# Altium footprint library 7SEG.PCBLIB: 21 footprints (part 2 of 2)
Each footprint in its own frame and in the unit in brackets; x right, y up, seen from the top. Pads: shape width x height; smd on the part's side, far side on the other; paste and mask are expansions set on the pad; w line width, h text height; cw(c..) or ccw(c..) is an arc to the next point about the centre after c.
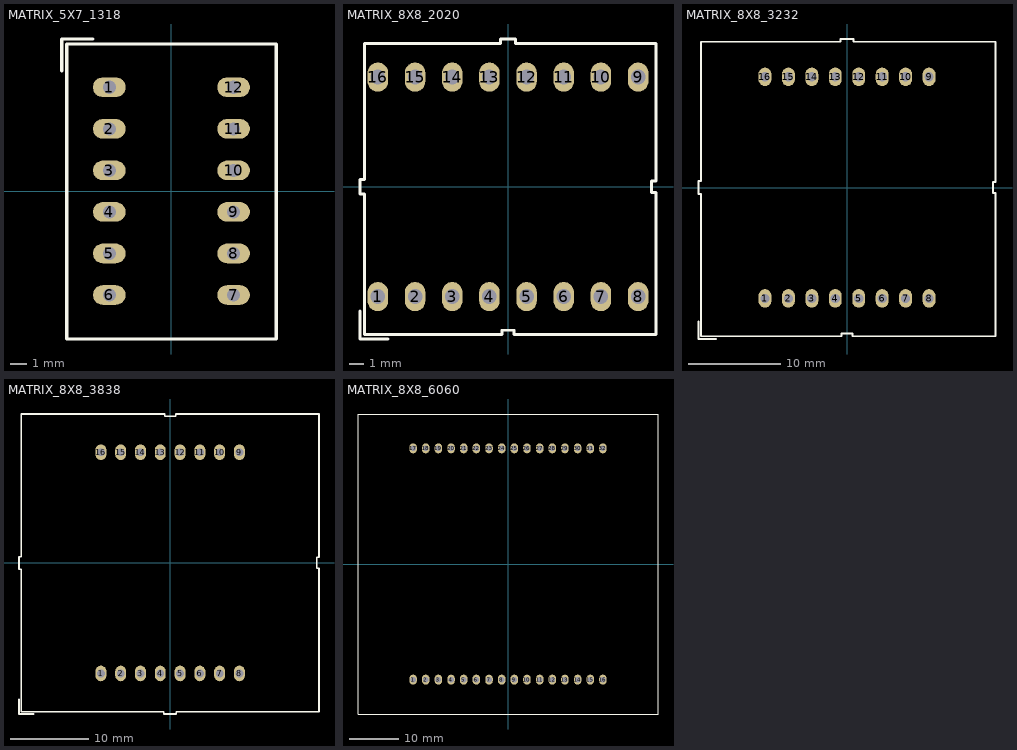
[diagram p1: the footprints below, top view; thin cyan lines are the x and y axes]

## MATRIX_5X7_1318 [mm] "LED Dot Matrix 5x7 12.7mmx17.8mm"
height 15.7
pads (12):
  oval 2x1.2 hole 0.8: 1(-3.8,6.35) 2(-3.8,3.81) 3(-3.8,1.27) 4(-3.8,-1.27) 5(-3.8,-3.81) 6(-3.8,-6.35) 7(3.8,-6.35) 8(3.8,-3.81) 9(3.8,-1.27) 10(3.8,1.27) 11(3.8,3.81) 12(3.8,6.35)
TopOverlay:
  lines w0.2: -6.7,7.36 -6.7,9.3 -4.8,9.3 ; -6.4,-9.04 -6.4,9 6.4,9 6.4,-9.04 -6.4,-9.04
3D body "User Library-18mm DOTMATRIX DISPLAY.step": height 6.4, standoff -5.5, extent -6.35,-8.89 6.35,8.89

## MATRIX_8X8_2020 [mm] "LED Dot Matrix 8x8 20mmx20mm"
height 15.7
pads (16):
  oval 1.4x2 hole 1: 1(-8.89,-7.5) 2(-6.35,-7.5) 3(-3.81,-7.5) 4(-1.27,-7.5) 5(1.27,-7.5) 6(3.81,-7.5) 7(6.35,-7.5) 8(8.89,-7.5) 9(8.89,7.5) 10(6.35,7.5) 11(3.81,7.5) 12(1.27,7.5) 13(-1.27,7.5) 14(-3.81,7.5) 15(-6.35,7.5) 16(-8.89,7.5)
TopOverlay:
  lines w0.2: -10.1,-8.5 -10.1,-10.4 -8.2,-10.4 ; -10.1,-0.5 -10.1,0.5 -9.8,0.5 -9.8,9.8 -0.5,9.8 -0.5,10.1 0.5,10.1 0.5,9.8 10.1,9.8 10.1,0.4 9.8,0.4 9.8,-0.4 10.1,-0.4 10.1,-10.1 0.4,-10.1 0.4,-9.8 -0.4,-9.8 -0.4,-10.1 -9.8,-10.1 -9.8,-0.5 -10.1,-0.5
3D body: height 5.46, standoff 2, extent -10,-10 10,10

## MATRIX_8X8_3232 [mm] "LED Dot Matrix 8x8 32mmx32mm"
height 15.7
pads (16):
  oval 1.4x2 hole 1: 1(-8.89,-12) 2(-6.35,-12) 3(-3.81,-12) 4(-1.27,-12) 5(1.27,-12) 6(3.81,-12) 7(6.35,-12) 8(8.89,-12) 9(8.89,12) 10(6.35,12) 11(3.81,12) 12(1.27,12) 13(-1.27,12) 14(-3.81,12) 15(-6.35,12) 16(-8.89,12)
TopOverlay:
  lines w0.2: -16.1,-14.5 -16.1,-16.4 -14.2,-16.4 ; -16.1,-0.7 -16.1,0.7 -15.8,0.7 -15.8,15.8 -0.7,15.8 -0.7,16.1 0.7,16.1 0.7,15.8 16.1,15.8 16.1,0.6 15.8,0.6 15.8,-0.6 16.1,-0.6 16.1,-16.1 0.6,-16.1 0.6,-15.8 -0.6,-15.8 -0.6,-16.1 -15.8,-16.1 -15.8,-0.7 -16.1,-0.7
3D body "User Library-Lite-On LTP-12088M.step": height 8, standoff -3.25, extent -15.964,-16 15.964,15.928

## MATRIX_8X8_3838 [mm] "LED Dot Matrix 8x8 38mmx38mm"
height 15.7
pads (16):
  oval 1.4x2 hole 1: 1(-8.89,-14.2) 2(-6.35,-14.2) 3(-3.81,-14.2) 4(-1.27,-14.2) 5(1.27,-14.2) 6(3.81,-14.2) 7(6.35,-14.2) 8(8.89,-14.2) 9(8.89,14.2) 10(6.35,14.2) 11(3.81,14.2) 12(1.27,14.2) 13(-1.27,14.2) 14(-3.81,14.2) 15(-6.35,14.2) 16(-8.89,14.2)
TopOverlay:
  lines w0.2: -19.4,-17.5 -19.4,-19.4 -17.5,-19.4 ; -19.4,-0.8 -19.1,-0.8 -19.1,-19.1 -0.8,-19.1 -0.8,-19.4 0.8,-19.4 0.8,-19.1 19.1,-19.1 19.1,-0.7 18.8,-0.7 18.8,0.7 19.1,0.7 19.1,19.1 0.7,19.1 0.7,18.8 -0.7,18.8 -0.7,19.1 -19.1,19.1 -19.1,0.8 -19.4,0.8 -19.4,-0.8
3D body "User Library-38x38_8x8_LED.step": height 10.4, standoff -4, extent -19.3,-19.3 19,19

## MATRIX_8X8_6060 [mm]
height 1.4
pads (32):
  oval 1.5x2 hole 1.1: 1(-19.05,-23.2) 2(-16.51,-23.2) 3(-13.97,-23.2) 4(-11.43,-23.2) 5(-8.89,-23.2) 6(-6.35,-23.2) 7(-3.81,-23.2) 8(-1.27,-23.2) 9(1.27,-23.2) 10(3.81,-23.2) 11(6.35,-23.2) 12(8.89,-23.2) 13(11.43,-23.2) 14(13.97,-23.2) 15(16.51,-23.2) 16(19.05,-23.2) 17(-19.05,23.2) 18(-16.51,23.2) 19(-13.97,23.2) 20(-11.43,23.2) 21(-8.89,23.2) 22(-6.35,23.2) 23(-3.81,23.2) 24(-1.27,23.2) 25(1.27,23.2) 26(3.81,23.2) 27(6.35,23.2) 28(8.89,23.2) 29(11.43,23.2) 30(13.97,23.2) 31(16.51,23.2) 32(19.05,23.2)
TopOverlay:
  lines w0.2: -30.1,-30.1 -30.1,30.1 30.1,30.1 30.1,-30.1 -30.1,-30.1
  text "." at 12.146,-30.425 h0.89
  text "." at -12.146,-30.425 h0.89
  text "." at -30.425,12.146 h0.89
  text "." at -30.425,-12.146 h0.89
3D body "User Library-Part1-76.STEP": height 7, standoff -4, extent -30,-30 30,30